# Altium footprint library ESP32.PcbLib: 14 footprints
Each footprint in its own frame and in the unit in brackets; x right, y up, seen from the top. Pads: shape width x height; smd on the part's side, far side on the other; paste and mask are expansions set on the pad; w line width, h text height; cw(c..) or ccw(c..) is an arc to the next point about the centre after c.
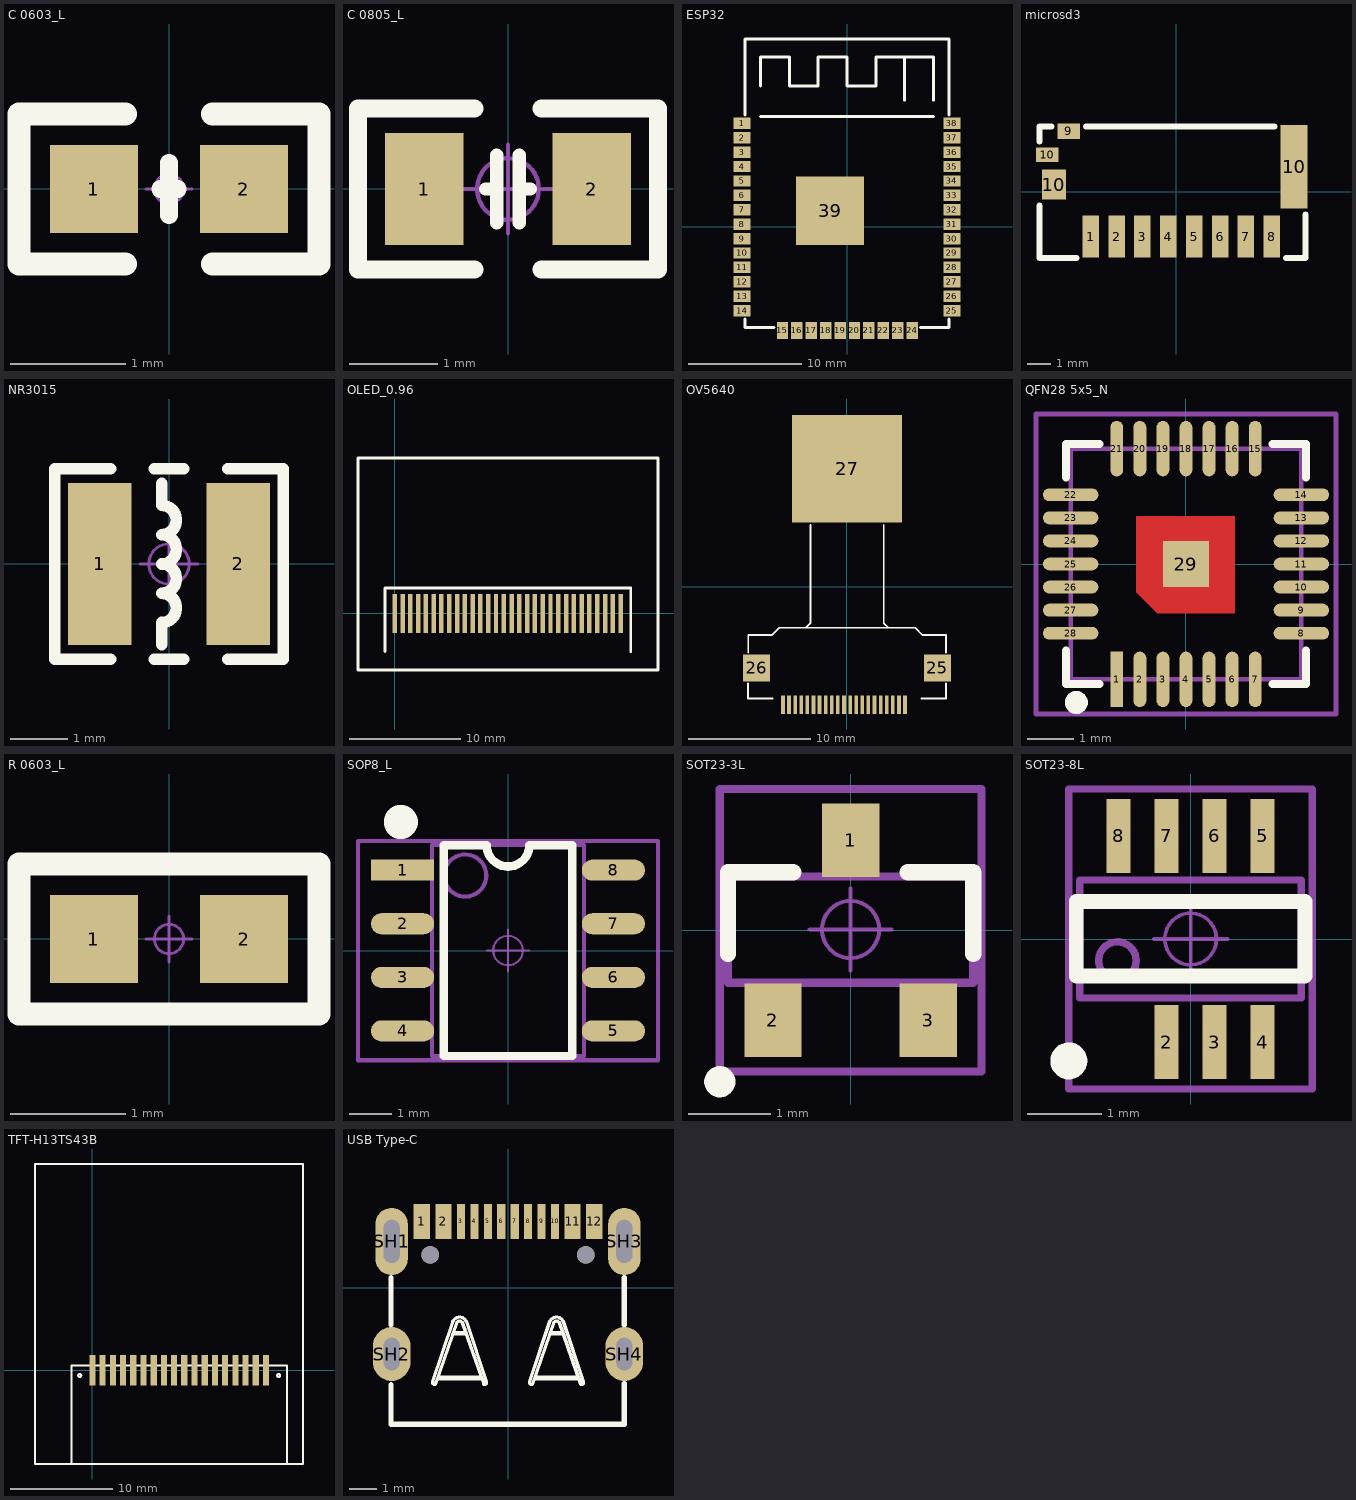
[diagram p0: the footprints below, top view; thin cyan lines are the x and y axes]

## C 0603_L [mil] "无极性贴片电容"
pads (2):
  rect 30x30 smd: 1(-25.59,0) 2(25.59,0)
Top Overlay:
  lines w6: -3,0 0,0 3,0 ; 0,-9 0,9
  lines w8: -15,-25.59 -51.18,-25.59 -51.18,25.59 -15,25.59 ; 15,-25.59 51.18,-25.59 51.18,25.59 15,25.59
Mechanical 15:
  circle w1: c0,0 r5
  lines w1: -7.87,0 7.87,0 ; 0,-7.87 0,7.87
3D body "C 0603.STEP": height 31.89, standoff -0.39, extent -31.5,-16.14 31.5,16.14

## C 0805_L [mil] "无极性贴片电容"
height 19.68
pads (2):
  rect 35x50 smd: 1(-37.4,0) 2(37.4,0)
Top Overlay:
  lines w6: -10,0 -5,0 ; -5,-15 -5,15 ; 5,-15 5,15 ; 5,0 10,0
  lines w8: -15,-36 -66.93,-36 -66.93,36 -15,36 ; 15,-36 66.93,-36 66.93,36 15,36
Mechanical 15:
  circle w1.97: c0,0 r13.78
  circle w1.97: c0,0 r13.78
  lines w1.97: -19.68,0 19.68,0 -19.68,0 ; 0,-19.69 0,19.68 0,-19.69
3D body "C 0805.STEP": height 20.08, standoff -0.39, extent -39.37,-24.02 39.37,24.02

## ESP32 [mil]
pads (39):
  rect 59.1x39.4 smd: 1(-364,359.5) 2(-364,309.5) 3(-364,259.5) 4(-364,209.5) 5(-364,159.5) 6(-364,109.5) 7(-364,59.5) 8(-364,9.5) 9(-364,-40.5) 10(-364,-90.5) 11(-364,-140.5) 12(-364,-190.5) 13(-364,-240.5) 14(-364,-290.5) 25(364,-290.5) 26(364,-240.5) 27(364,-190.5) 28(364,-140.5) 29(364,-90.5) 30(364,-40.5) 31(364,9.5) 32(364,59.5) 33(364,109.5) 34(364,159.5) 35(364,209.5) 36(364,259.5) 37(364,309.5) 38(364,359.5)
  rect 39.4x59.1 smd: 15(-224,-359.5) 16(-174,-359.5) 17(-124,-359.5) 18(-74,-359.5) 19(-24,-359.5) 20(26,-359.5) 21(76,-359.5) 22(126,-359.5) 23(176,-359.5) 24(226,-359.5)
  rect 236.2x236.2 smd: 39(-58.72,56.01)
Top Overlay:
  lines w10: -354,-319.3 -354,-349.5 -252.8,-349.5 ; -354,388.3 -354,652.17 354,652.17 354,388.3 ; -300,383.5 300,383.5 ; -300,489.5 -300,589.5 -200,589.5 -200,489.5 -100,489.5 -100,589.5 0,589.5 0,489.5 100,489.5 100,589.5 250,589.5 300,589.5 300,439.5 ; 200,439.5 200,589.5 ; 254.8,-349.5 354,-349.5 354,-319.3
3D body "User Library-ESP321.step": height 114.37, standoff -0.28, extent -355,-350 353.66,653.94

## microsd3 [mm]
pads (12):
  rect 0.7x1.8 smd: 1(-3.645,-1.905) 2(-2.545,-1.905) 3(-1.445,-1.905) 4(-0.345,-1.905) 5(0.755,-1.905) 6(1.855,-1.905) 7(2.955,-1.905) 8(4.055,-1.905)
  rect 0.965x0.66 smd: 9(-4.572,2.565)
  rect 0.965x0.61 smd: 10(-5.486,1.575)
  rect 1.016x1.27 smd: 10(-5.207,0.305)
  rect 1.143x3.556 smd: 10(5.004,1.067)
Top Overlay:
  lines w0.254: -5.817,-0.584 -5.817,-2.819 -4.242,-2.819 ; -5.817,2.134 -5.817,2.769 -5.309,2.769 ; -3.835,2.769 4.166,2.769 ; 4.648,-2.819 5.486,-2.819 5.486,-0.965
3D body "User Library-TF-021B.STEP": height 2.67, standoff 0.02, extent -5.786,-2.724 5.614,2.776

## NR3015 [mm]
pads (2):
  rect 1.1x2.8 smd: 1(-1.2,0) 2(1.2,0)
Top Overlay:
  lines w0.203: -1.016,-1.651 -1.981,-1.651 -1.981,1.651 -1.016,1.651 ; -0.254,-1.651 0.254,-1.651 ; -0.254,1.651 0.254,1.651 ; -0.127,-1.397 -0.127,-1.016 ccw(c-0.127,-0.762) -0.127,-0.508 ccw(c-0.127,-0.254) -0.127,0 ccw(c-0.127,0.254) -0.127,0.508 ccw(c-0.127,0.762) -0.127,1.016 -0.127,1.397 ; 1.016,-1.651 1.981,-1.651 1.981,1.651 1.016,1.651
Mechanical 15:
  circle w0.05: c0,0 r0.35
  lines w0.05: -0.5,0 0.5,0 ; 0,-0.5 0,0.5
3D body "NR3015.STEP": height 1.45, standoff 0.05, extent -1.5,-1.5 1.5,1.5

## OLED_0.96 [mm]
pads (30):
  rect 0.4x3.5 smd: 1(0,0) 2(0.7,0) 3(1.4,0) 4(2.1,0) 5(2.8,0) 6(3.5,0) 7(4.2,0) 8(4.9,0) 9(5.6,0) 10(6.3,0) 11(7,0) 12(7.7,0) 13(8.4,0) 14(9.1,0) 15(9.8,0) 16(10.5,0) 17(11.2,0) 18(11.9,0) 19(12.6,0) 20(13.3,0) 21(14,0) 22(14.7,0) 23(15.4,0) 24(16.1,0) 25(16.8,0) 26(17.5,0) 27(18.2,0) 28(18.9,0) 29(19.6,0) 30(20.3,0)
Top Overlay:
  lines w0.254: -0.889,-3.429 -0.889,2.286 21.209,2.286 21.209,-3.429 ; 4.318,13.97 23.66,13.97 23.66,-5.08 -3.302,-5.08 -3.302,13.97 4.572,13.97

## OV5640 [mm] "fpc24"
pads (24):
  rect 0.3x1.5 smd: 2(-5.247,-9.658) 3(-4.747,-9.658) 4(-4.247,-9.658) 5(-3.747,-9.658) 6(-3.247,-9.658) 7(-2.747,-9.658) 8(-2.247,-9.658) 9(-1.747,-9.658) 10(-1.247,-9.658) 11(-0.747,-9.658) 12(-0.247,-9.658) 13(0.253,-9.658) 14(0.753,-9.658) 15(1.253,-9.658) 16(1.753,-9.658) 17(2.253,-9.658) 18(2.753,-9.658) 19(3.253,-9.658) 20(3.753,-9.658) 21(4.253,-9.658) 22(4.753,-9.658)
  rect 2.2x2.2 smd: 25(7.404,-6.636) 26(-7.404,-6.636)
  rect 9x8.8 smd: 27(0.006,9.658)
Top Overlay:
  lines w0.152: -8.103,-7.906 -8.103,-9.15 -6.083,-9.15 ; -8.09,-5.366 -8.09,-3.95 ; -8.071,-3.95 -6.179,-3.95 -6.16,-3.95 -5.56,-3.35 ; -5.417,-3.35 -5.56,-3.35 ; -3.588,-3.35 -3.376,-3.35 -2.994,-2.968 -2.994,5.074 ; 3.006,5.074 3.006,3.766 3.006,-2.934 3.006,-2.959 3.397,-3.35 ; 3.439,-3.35 3.524,-3.35 ; 6.083,-9.15 8.103,-9.15 8.103,-7.906 ; 8.103,-5.366 8.103,-3.95 ; 8.103,-3.943 8.096,-3.95 6.183,-3.95 5.583,-3.35 -5.56,-3.35
3D body "FPC0.5 2H-S-W-24P.STEP": height 2, standoff -0.01, extent -8.097,-9.398 8.103,-3.398
3D body "User Library-ov9655.STEP": height 6.13, standoff 0.1, extent -6.252,-7.473 6.248,14.027

## QFN28 5x5_N [mm] "28脚，长x宽x高：5x5x0.8mm，脚距：0.5mm"
pads (29):
  rect 0.28x1.2 smd: 1(-1.5,-2.5)
  oval 0.28x1.2 smd: 2(-1,-2.5) 3(-0.5,-2.5) 4(0,-2.5) 5(0.5,-2.5) 6(1,-2.5) 7(1.5,-2.5) 15(1.5,2.5) 16(1,2.5) 17(0.5,2.5) 18(0,2.5) 19(-0.5,2.5) 20(-1,2.5) 21(-1.5,2.5)
  oval 1.2x0.28 smd: 8(2.5,-1.5) 9(2.5,-1) 10(2.5,-0.5) 11(2.5,0) 12(2.5,0.5) 13(2.5,1) 14(2.5,1.5) 22(-2.5,1.5) 23(-2.5,1) 24(-2.5,0.5) 25(-2.5,0) 26(-2.5,-0.5) 27(-2.5,-1) 28(-2.5,-1.5)
  rect 1x1 smd: 29(0,0)
Top Layer:
  region: -1.081,1.04 1.052,1.04 1.052,-1.068 -0.624,-1.068 -1.081,-0.611
Top Overlay:
  circle w0.25: c-2.375,-3 r0.125
  lines w0.178: -2.6,-1.875 -2.6,-2.6 -1.875,-2.6 ; -2.6,1.875 -2.6,2.6 -1.875,2.6 ; 1.875,-2.6 2.6,-2.6 2.6,-1.875 ; 1.875,2.6 2.6,2.6 2.6,1.875
Mechanical 13:
  lines w0.1: -2.501,-2.501 -2.501,2.501 2.5,2.501 2.5,-2.501 -2.501,-2.501
Mechanical 15:
  circle w0.05: c0,0 r0.35
  lines w0.05: -0.5,0 0.5,0 ; 0,-0.5 0,0.5
  lines w0.1: -3.25,-3.25 3.25,-3.25 3.25,3.25 -3.25,3.25 -3.25,-3.25
3D body "QFN28-5X5.STEP": height 0.75, standoff -0.05, extent -2.51,-2.51 2.51,2.51

## R 0603_L [mil] "1/10W贴片电阻"
pads (2):
  rect 30x30 smd: 1(-25.59,0) 2(25.59,0)
Top Overlay:
  lines w8: -51.18,-25.59 -51.18,25.59 51.18,25.59 51.18,-25.59 -51.18,-25.59
Mechanical 15:
  circle w1: c0,0 r5
  lines w1: -7.87,0 7.87,0 ; 0,-7.87 0,7.87
3D body "R 0603.STEP": height 15.79, standoff -0.13, extent -31.49,-15.74 31.5,15.75

## SOP8_L [mm] "5*6*1.8mm（长宽高）"
height 1.75
pads (8):
  rect 1.5x0.5 smd: 1(-2.5,1.905)
  oval 1.5x0.5 smd: 2(-2.5,0.635) 3(-2.5,-0.635) 4(-2.5,-1.905) 5(2.5,-1.905) 6(2.5,-0.635) 7(2.5,0.635) 8(2.5,1.905)
Top Overlay:
  circle w0.5: c-2.54,3.048 r0.155
  lines w0.2: -1.524,2.5 -1.524,-2.5 1.524,-2.5 1.524,2.5
  lines w0.203: -1.524,2.5 -0.508,2.5 ccw(c0,2.5) 0,1.992 ccw(c0,2.5) 0.508,2.5 1.524,2.5
Mechanical 13:
  circle w0.1: c-1.016,1.778 r0.5
  lines w0.1: -1.8,-2.5 -1.8,2.5 1.8,2.5 1.8,-2.5 -1.8,-2.5
Mechanical 15:
  circle w0.05: c0,0 r0.35
  lines w0.05: -0.5,0 0.5,0 ; 0,-0.5 0,0.5
  lines w0.1: -3.556,-2.6 -3.556,2.6 3.556,2.6 3.556,-2.6 -3.556,-2.6
3D body "SOP8.STEP": height 1.9, standoff 0, extent -3.003,-2.5 3.003,2.5

## SOT23-3L [mm]
pads (3):
  rect 0.7x0.9 smd: 1(0,1.1) 2(-0.95,-1.1) 3(0.95,-1.1)
Top Overlay:
  circle w0.203: c-1.6,-1.852 r0.089
  lines w0.2: -1.5,-0.291 -1.5,0.709 -0.7,0.709 ; 0.7,0.709 1.5,0.709 1.5,-0.291
Mechanical 13:
  lines w0.1: -1.5,-0.641 -1.5,0.659 1.5,0.659 1.5,-0.641 -1.5,-0.641
Mechanical 15:
  circle w0.05: c0,0.009 r0.35
  lines w0.05: -0.5,0.009 0.5,0.009 ; 0,-0.491 0,0.509
  lines w0.1: -1.6,-1.727 -1.6,1.727 1.6,1.727 1.6,-1.727 -1.6,-1.727
3D body "SOT23-3.STEP": height 1.05, standoff 0, extent -1.5,-1.191 1.5,1.209

## SOT23-8L [mm] "3x1.6x1.1mm(长宽高)"
height 1.45
pads (7):
  rect 0.325x1 smd: 2(-0.325,-1.397) 3(0.325,-1.397) 4(0.975,-1.397) 5(0.975,1.397) 6(0.325,1.397) 7(-0.325,1.397) 8(-0.975,1.397)
Top Overlay:
  circle w0.25: c-1.65,-1.651 r0.125
  lines w0.2: -1.55,-0.5 -1.55,0.508 1.55,0.508 1.55,-0.5 -1.55,-0.5
Mechanical 13:
  circle w0.1: c-0.992,-0.292 r0.254
  lines w0.1: -1.5,-0.8 1.5,-0.8 1.5,0.8 -1.5,0.8 -1.5,-0.8
Mechanical 15:
  circle w0.05: c0,0 r0.35
  lines w0.05: -0.5,0 0.5,0 ; 0,-0.5 0,0.5
  lines w0.1: -1.65,-2.032 1.65,-2.032 1.65,2.032 -1.65,2.032 -1.65,-2.032
3D body "SOT23-8.STEP": height 1.15, standoff 0, extent -1.5,-1.403 1.5,1.403

## TFT-H13TS43B [mm]
pads (18):
  rect 0.6x3 smd: 1(0,0) 2(1,0) 3(2,0) 4(3,0) 5(4,0) 6(5,0) 7(6,0) 8(7,0) 9(8,0) 10(9,0) 11(10,0) 12(11,0) 13(12,0) 14(13,0) 15(14,0) 16(15,0) 17(16,0) 18(17,0)
Top Overlay:
  circle w0.2: c-1.25,-0.502 r0.15
  circle w0.2: c18.25,-0.502 r0.15
  lines w0.2: -2.05,-9.172 -2.05,0.498 19.05,0.498 19.05,-9.172 ; -5.65,-9.172 20.65,-9.172 20.65,20.228 -5.65,20.228 -5.65,-9.172
3D body: height 2.1, standoff 0, extent -5.675,-9.175 20.675,20.2
3D body: height 1.8, standoff 0, extent -4.5,-5.05 19.5,18.95

## USB Type-C [mm] "USB Type-C 12P/16P"
height 2.96
pads (18):
  rect 0.6x1.3 smd mask+0.064: 1(-3.2,2.462) 2(-2.4,2.462) 11(2.4,2.462) 12(3.2,2.462)
  rect 0.3x1.3 smd mask+0.064: 3(-1.75,2.462) 4(-1.25,2.462) 5(-0.75,2.462) 6(-0.25,2.463) 7(0.25,2.463) 8(0.75,2.462) 9(1.25,2.462) 10(1.75,2.462)
  oval 1.2x2.5 hole 0.6 slot 1.6 at 90 deg: SH1(-4.32,1.718) SH3(4.32,1.717)
  oval 1.4x2 hole 0.6 slot 1.2 at 90 deg: SH2(-4.32,-2.462) SH4(4.32,-2.462)
  round 0.65 hole 0.65 unplated mask+0: ""(-2.89,1.218) ""(2.89,1.218)
Top Overlay:
  lines w0.12: -2.623,-3.39 -0.973,-3.39 ; -2.598,-3.315 -0.998,-3.315 ; -2.048,-1.715 -1.548,-1.715 ; -2.023,-1.665 -1.573,-1.665 ; 0.977,-3.39 2.627,-3.39 ; 1.002,-3.315 2.602,-3.315 ; 1.552,-1.715 2.052,-1.715 ; 1.577,-1.665 2.027,-1.665 ; -1.713,-1.275 ccw(c-1.798,-1.361) -1.798,-1.24 ccw(c-1.798,-1.361) -1.883,-1.275 -1.898,-1.29 -2.698,-3.59 cw(c-2.723,-3.515) -2.798,-3.49 -2.048,-1.24 -1.969,-1.161 cw(c-1.798,-1.331) -1.798,-1.09 cw(c-1.798,-1.331) -1.627,-1.161 -1.548,-1.24 -0.798,-3.49 cw(c-0.873,-3.515) -0.898,-3.59 -1.698,-1.29 ; -1.713,-1.275 -1.698,-1.29 ; -1.713,-1.275 -1.698,-1.29 ; 1.702,-1.29 1.717,-1.275 ; 1.702,-1.29 0.902,-3.59 cw(c0.877,-3.515) 0.802,-3.49 1.552,-1.24 1.631,-1.161 cw(c1.802,-1.331) 1.802,-1.09 cw(c1.802,-1.331) 1.973,-1.161 2.052,-1.24 2.802,-3.49 cw(c2.727,-3.515) 2.702,-3.59 1.902,-1.29 1.887,-1.275 ccw(c1.802,-1.361) 1.802,-1.24 ccw(c1.802,-1.361) 1.717,-1.275 ; 1.702,-1.29 1.717,-1.275
  lines w0.2: -4.343,-3.593 -4.343,-5.066 4.32,-5.066 4.32,-3.562 ; -4.343,-1.385 -4.343,0.37 ; 4.32,-1.382 4.32,0.373
3D body "User Library-USB Type C Port (SMD Type).STEP": height 3.2, standoff -1, extent -4.47,-5.04 4.47,2.86